# Altium footprint library Connectors Pad Lib.PcbLib: 211 footprints (part 6 of 14)
Each footprint in its own frame and in the unit in brackets; x right, y up, seen from the top. Pads: shape width x height; smd on the part's side, far side on the other; paste and mask are expansions set on the pad; w line width, h text height; cw(c..) or ccw(c..) is an arc to the next point about the centre after c.
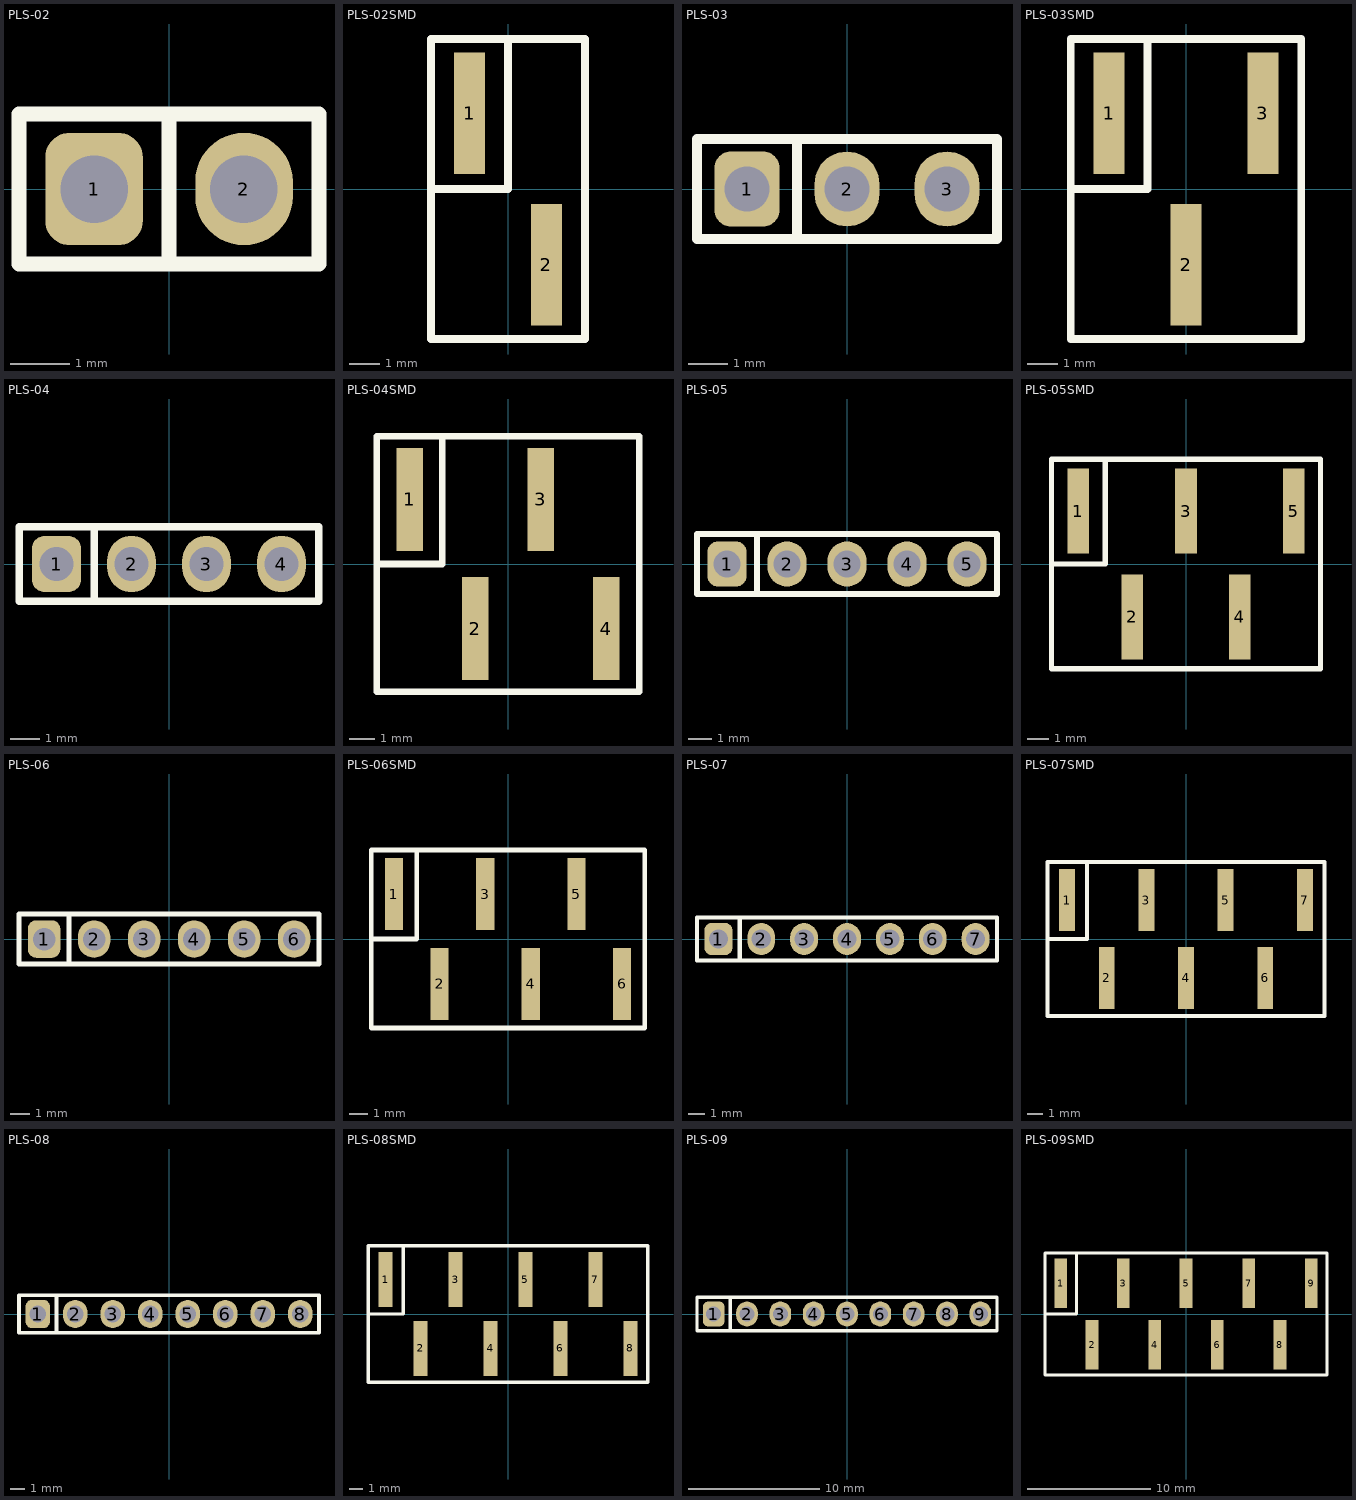
[diagram p5: the footprints below, top view; thin cyan lines are the x and y axes]

## PLS-02 [mil] "PCB Vertical Single Connector 2-Pin"
height 336.22
pads (2):
  rrect50% 65x75 hole 45: 1(-50,0)
  oval 65x75 hole 45: 2(50,0)
Top Overlay:
  lines w10: 0,-50 0,50 ; -100,-50 100,-50 100,50 -100,50 -100,-50
3D body "PLS-02.STEP": height 337.22, standoff -117.11, extent -100,-50 100,50

## PLS-02SMD [mm] "PCB Vertical Single Connector SMD 2-Pin"
height 10.338
pads (2):
  rect 1.02x4 smd: 1(-1.27,2.5) 2(1.27,-2.5)
Top Overlay:
  lines w0.254: -2.54,0 0,0 0,4.953 -0.127,4.953 ; -2.54,-4.953 2.54,-4.953 2.54,4.953 -2.54,4.953 -2.54,-4.953
3D body "PLS-02SMD.STEP": height 10.34, standoff -0.02, extent -2.54,-4.27 2.54,4.27

## PLS-03 [mil] "PCB Vertical Single Connector 3-Pin"
height 336.22
pads (3):
  rrect50% 65x75 hole 45: 1(-100,0)
  oval 65x75 hole 45: 2(0,0) 3(100,0)
Top Overlay:
  lines w10: -50,-50 -50,50 ; -150,-50 150,-50 150,50 -150,50 -150,-50
3D body "PLS-03.STEP": height 337.22, standoff -117.11, extent -150,-50 150,50

## PLS-03SMD [mm] "PCB Vertical Single Connector SMD 3-Pin"
height 10.338
pads (3):
  rect 1.02x4 smd: 1(-2.54,2.5) 2(0,-2.5) 3(2.54,2.5)
Top Overlay:
  lines w0.254: -3.81,0 -1.27,0 -1.27,4.953 -0.127,4.953 ; -3.81,-4.953 3.81,-4.953 3.81,4.953 -3.81,4.953 -3.81,-4.953
3D body "PLS-03SMD.STEP": height 10.34, standoff -0.02, extent -3.81,-4.27 3.81,4.27

## PLS-04 [mil] "PCB Vertical Single Connector 4-Pin"
height 336.22
pads (4):
  rrect50% 65x75 hole 45: 1(-150,0)
  oval 65x75 hole 45: 2(-50,0) 3(50,0) 4(150,0)
Top Overlay:
  lines w10: -100,-50 -100,50 ; -200,-50 -200,50 200,50 200,-50 -200,-50
3D body "PLS-04.STEP": height 337.22, standoff -117.11, extent -200,-50 200,50

## PLS-04SMD [mm] "PCB Vertical Single Connector SMD 4-Pin"
height 10.338
pads (4):
  rect 1.02x4 smd: 1(-3.81,2.5) 2(-1.27,-2.5) 3(1.27,2.5) 4(3.81,-2.5)
Top Overlay:
  lines w0.254: -5.08,0 -2.54,0 -2.54,4.953 -0.127,4.953 ; -5.08,-4.953 -5.08,4.953 5.08,4.953 5.08,-4.953 -5.08,-4.953
3D body "PLS-04SMD.STEP": height 10.34, standoff -0.02, extent -5.08,-4.27 5.08,4.27

## PLS-05 [mil] "PCB Vertical Single Connector 5-Pin"
height 336.22
pads (5):
  rrect50% 65x75 hole 45: 1(-200,0)
  oval 65x75 hole 45: 2(-100,0) 3(0,0) 4(100,0) 5(200,0)
Top Overlay:
  lines w10: -150,-50 -150,50 ; -250,-50 250,-50 250,50 -250,50 -250,-50
3D body "PLS-05.STEP": height 337.22, standoff -117.11, extent -250,-50 250,50

## PLS-05SMD [mm] "PCB Vertical Single Connector SMD 5-Pin"
height 10.338
pads (5):
  rect 1.02x4 smd: 1(-5.08,2.5) 2(-2.54,-2.5) 3(0,2.5) 4(2.54,-2.5) 5(5.08,2.5)
Top Overlay:
  lines w0.254: -6.35,0 -3.81,0 -3.81,4.953 -0.127,4.953 ; -6.35,-4.953 -6.35,4.953 6.35,4.953 6.35,-4.953 -6.35,-4.953
3D body "PLS-05SMD.STEP": height 10.34, standoff -0.02, extent -6.35,-4.27 6.35,4.27

## PLS-06 [mil] "PCB Vertical Single Connector 6-Pin"
height 336.22
pads (6):
  rrect50% 65x75 hole 45: 1(-250,0)
  oval 65x75 hole 45: 2(-150,0) 3(-50,0) 4(50,0) 5(150,0) 6(250,0)
Top Overlay:
  lines w10: -200,-50 -200,50 ; -300,-50 -300,50 300,50 300,-50 -300,-50
3D body "PLS-06.STEP": height 337.22, standoff -117.11, extent -300,-50 300,50

## PLS-06SMD [mm] "PCB Vertical Single Connector SMD 6-Pin"
height 10.338
pads (6):
  rect 1.02x4 smd: 1(-6.35,2.5) 2(-3.81,-2.5) 3(-1.27,2.5) 4(1.27,-2.5) 5(3.81,2.5) 6(6.35,-2.5)
Top Overlay:
  lines w0.254: -7.62,0 -5.08,0 -5.08,4.953 -0.127,4.953 ; -7.62,-4.953 -7.62,4.953 7.62,4.953 7.62,-4.953 -7.62,-4.953
3D body "PLS-06SMD.STEP": height 10.34, standoff -0.02, extent -7.62,-4.27 7.62,4.27

## PLS-07 [mil] "PCB Vertical Single Connector 7-Pin"
height 336.22
pads (7):
  rrect50% 65x75 hole 45: 1(-300,0)
  oval 65x75 hole 45: 2(-200,0) 3(-100,0) 4(0,0) 5(100,0) 6(200,0) 7(300,0)
Top Overlay:
  lines w10: -250,-50 -250,50 ; -350,-50 -350,50 350,50 350,-50 -350,-50
3D body "PLS-07.STEP": height 337.22, standoff -117.11, extent -350,-50 350,50

## PLS-07SMD [mm] "PCB Vertical Single Connector SMD 7-Pin"
height 10.338
pads (7):
  rect 1.02x4 smd: 1(-7.62,2.5) 2(-5.08,-2.5) 3(-2.54,2.5) 4(0,-2.5) 5(2.54,2.5) 6(5.08,-2.5) 7(7.62,2.5)
Top Overlay:
  lines w0.254: -8.89,0 -6.35,0 -6.35,4.953 -0.127,4.953 ; -8.89,-4.953 8.89,-4.953 8.89,4.953 -8.89,4.953 -8.89,-4.953
3D body "PLS-07SMD.STEP": height 10.34, standoff -0.02, extent -8.89,-4.27 8.89,4.27

## PLS-08 [mil] "PCB Vertical Single Connector 8-Pin"
height 336.22
pads (8):
  rrect50% 65x75 hole 45: 1(-350,0)
  oval 65x75 hole 45: 2(-250,0) 3(-150,0) 4(-50,0) 5(50,0) 6(150,0) 7(250,0) 8(350,0)
Top Overlay:
  lines w10: -300,-50 -300,50 ; -400,-50 400,-50 400,50 -400,50 -400,-50
3D body "PLS-08.STEP": height 337.22, standoff -117.11, extent -400,-50 400,50

## PLS-08SMD [mm] "PCB Vertical Single Connector SMD 8-Pin"
height 10.338
pads (8):
  rect 1.02x4 smd: 1(-8.89,2.5) 2(-6.35,-2.5) 3(-3.81,2.5) 4(-1.27,-2.5) 5(1.27,2.5) 6(3.81,-2.5) 7(6.35,2.5) 8(8.89,-2.5)
Top Overlay:
  lines w0.254: -10.16,0 -7.62,0 -7.62,4.953 -0.127,4.953 ; -10.16,-4.953 10.16,-4.953 10.16,4.953 -10.16,4.953 -10.16,-4.953
3D body "PLS-08SMD.STEP": height 10.34, standoff -0.02, extent -10.16,-4.27 10.16,4.27

## PLS-09 [mil] "PCB Vertical Single Connector 9-Pin"
height 336.22
pads (9):
  rrect50% 65x75 hole 45: 1(-400,0)
  oval 65x75 hole 45: 2(-300,0) 3(-200,0) 4(-100,0) 5(0,0) 6(100,0) 7(200,0) 8(300,0) 9(400,0)
Top Overlay:
  lines w10: -350,-50 -350,50 ; -450,-50 450,-50 450,50 -450,50 -450,-50
3D body "PLS-09.STEP": height 341.16, standoff -117.11, extent -450,-50 450,50

## PLS-09SMD [mm] "PCB Vertical Single Connector SMD 9-Pin"
height 10.338
pads (9):
  rect 1.02x4 smd: 1(-10.16,2.5) 2(-7.62,-2.5) 3(-5.08,2.5) 4(-2.54,-2.5) 5(0,2.5) 6(2.54,-2.5) 7(5.08,2.5) 8(7.62,-2.5) 9(10.16,2.5)
Top Overlay:
  lines w0.254: -11.43,0 -8.89,0 -8.89,4.953 -0.127,4.953 ; -11.43,-4.953 11.43,-4.953 11.43,4.953 -11.43,4.953 -11.43,-4.953
3D body "PLS-09SMD.STEP": height 10.34, standoff -0.02, extent -11.43,-4.27 11.43,4.27